# Altium footprint library Face_InMain1V0.PcbLib: 83 footprints (part 4 of 6)
Each footprint in its own frame and in the unit in brackets; x right, y up, seen from the top. Pads: shape width x height; smd on the part's side, far side on the other; paste and mask are expansions set on the pad; w line width, h text height; cw(c..) or ccw(c..) is an arc to the next point about the centre after c.
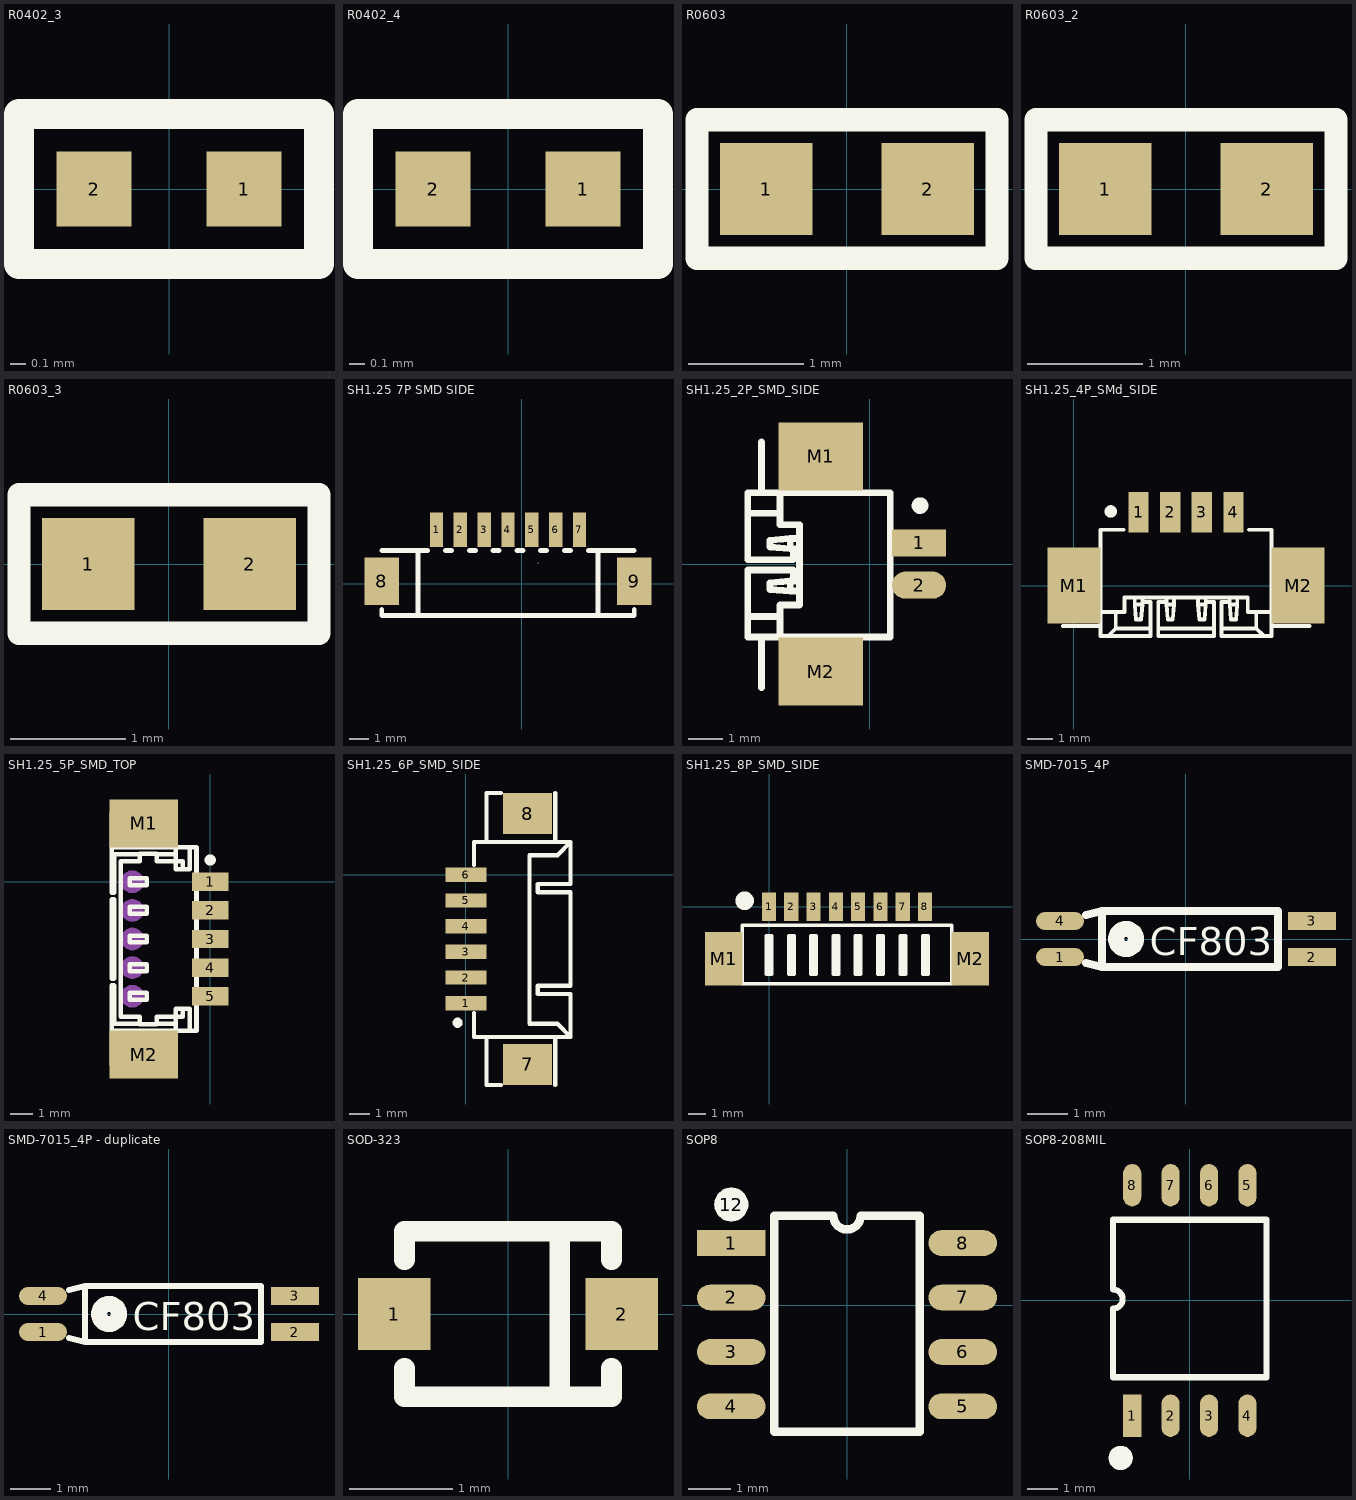
[diagram p3: the footprints below, top view; thin cyan lines are the x and y axes]

## R0402_3 [mm]
pads (2):
  rect 0.5x0.5 smd: 1(0.5,0) 2(-0.5,0)
Top Overlay:
  lines w0.2: -1,-0.5 -1,0.5 1,0.5 1,-0.5 -1,-0.5
3D body "User Library-R_0402.STEP": height 0.35, standoff 0, extent -0.5,-0.25 0.5,0.25

## R0402_4 [mm]
pads (2):
  rect 0.5x0.5 smd: 1(0.5,0) 2(-0.5,0)
Top Overlay:
  lines w0.2: -1,-0.5 1,-0.5 1,0.5 -1,0.5 -1,-0.5
3D body "User Library-R_0402.STEP": height 0.35, standoff 0, extent -0.5,-0.25 0.5,0.25

## R0603 [mm]
pads (2):
  rect 0.8x0.8 smd: 1(-0.7,0) 2(0.7,0)
Top Overlay:
  lines w0.2: -1.3,-0.6 -1.3,0.6 1.3,0.6 1.3,-0.6 -1.3,-0.6
3D body "User Library-RES_1609-0603.STEP": height 0.56, standoff 0, extent -0.85,-0.4 0.85,0.4

## R0603_2 [mm]
pads (2):
  rect 0.8x0.8 smd: 1(-0.7,0) 2(0.7,0)
Top Overlay:
  lines w0.2: -1.3,-0.6 1.3,-0.6 1.3,0.6 -1.3,0.6 -1.3,-0.6
3D body "User Library-RES_1609-0603.STEP": height 0.56, standoff 0, extent -0.85,-0.4 0.85,0.4

## R0603_3 [mm]
pads (2):
  rect 0.8x0.8 smd: 1(-0.7,0) 2(0.7,0)
Top Overlay:
  lines w0.2: -1.3,-0.6 -1.3,0.6 1.3,0.6 1.3,-0.6 -1.3,-0.6
3D body "User Library-RES_1609-0603.STEP": height 0.56, standoff 0, extent -0.85,-0.4 0.85,0.4

## SH1.25 7P SMD SIDE [mm] "1.25mm_7P_SMD_Side"
pads (9):
  rect 0.7x1.8 smd: 1(-4.48,2.85) 2(-3.23,2.85) 3(-1.98,2.85) 4(-0.73,2.85) 5(0.52,2.85) 6(1.77,2.85) 7(3.02,2.85)
  rect 1.801x2.499 smd: 8(-7.355,0.15) 9(5.895,0.15)
Top Overlay:
  lines w0.254: -7.356,-1.331 -7.356,-1.651 5.895,-1.651 5.895,-1.331 ; -7.355,1.75 -4.943,1.75 ; -5.455,-1.65 -5.455,1.75 ; -4.017,1.75 -3.693,1.75 ; -2.767,1.75 -2.443,1.75 ; -1.517,1.75 -1.193,1.75 ; -0.267,1.75 0.057,1.75 ; 0.983,1.75 1.307,1.75 ; 2.233,1.75 2.557,1.75 ; 3.483,1.75 5.895,1.75 ; 3.995,-1.651 3.995,1.75
Mechanical 15:
  lines w0.003: 0.832,1.088 0.883,1.138
3D body "10114830-xxx07lfc.stp": height 3.5, standoff 0.02, extent -7.65,-1.85 6.25,3.45

## SH1.25_2P_SMD_SIDE [mm]
pads (4):
  rect 1.6x0.8 smd: 1(1.45,0.625)
  oval 1.6x0.8 smd: 2(1.45,-0.625)
  rect 2.5x2 smd: M1(-1.45,3.175) M2(-1.45,-3.175)
Top Overlay:
  circle w0.254: c1.479,1.722 r0.119
  lines w0.2: -3.6,-1.55 -2.65,-1.55 ; -3.6,1.5 -2.65,1.5 ; -3.2,-3.65 -3.2,-2.15 ; -3.2,2.1 -3.2,3.6 ; -2.65,-2.15 -2.65,-1.21 -2.08,-1.21 -2.08,1.16 -2.65,1.16 -2.65,2.1 ; -2.26,-0.5 -2.26,-0.175 -3.6,-0.175 -3.6,-2.15 0.6,-2.15 0.6,2.1 -3.6,2.1 -3.6,0.125 -2.26,0.125 -2.26,0.45 ; -2.08,-0.8 -2.35,-0.8 ; -2.08,-0.5 -2.35,-0.5 ; -2.08,0.45 -2.35,0.45 ; -2.08,0.75 -2.35,0.75 ; -2.35,-0.8 -2.95,-0.75 -2.95,-0.55 -2.35,-0.5 ; -2.35,-0.8 -2.35,-0.5 ; -2.35,0.45 -2.95,0.5 -2.95,0.7 -2.35,0.75 ; -2.35,0.45 -2.35,0.75
3D body "10114830-XXX02LFc.stp": height 3.4, standoff -0.08, extent -3.5,-3.85 1.8,3.8

## SH1.25_4P_SMd_SIDE [mm] "WTB 1.25MM WAFER 90 DEGREE SMT"
pads (6):
  rect 0.8x1.6 smd: 1(2.55,2.9) 2(3.8,2.9) 3(5.05,2.9) 4(6.3,2.9)
  rect 2.1x3 smd: M1(0,0) M2(8.85,0)
Top Overlay:
  circle w0.254: c1.453,2.929 r0.119
  lines w0.15: -0.447,-1.592 1.053,-1.592 ; 1.053,-1.042 1.993,-1.042 1.993,-0.472 6.863,-0.472 6.863,-1.042 7.803,-1.042 ; 1.353,-1.992 1.653,-1.692 ; 1.653,-1.042 1.653,-1.692 ; 1.953,2.208 1.053,2.208 1.053,-1.992 3.028,-1.992 3.028,-0.652 2.703,-0.652 ; 2.403,-0.472 2.403,-0.742 ; 2.703,-0.472 2.703,-0.742 ; 3.028,-1.692 1.653,-1.692 ; 3.328,-1.692 5.528,-1.692 ; 3.653,-0.652 3.328,-0.652 3.328,-1.992 5.528,-1.992 5.528,-0.652 5.203,-0.652 ; 3.653,-0.472 3.653,-0.742 ; 3.953,-0.472 3.953,-0.742 ; 4.903,-0.472 4.903,-0.742 ; 5.203,-0.472 5.203,-0.742 ; 5.828,-1.692 7.203,-1.692 ; 6.153,-0.652 5.828,-0.652 5.828,-1.992 7.803,-1.992 7.803,2.208 6.903,2.208 ; 6.153,-0.472 6.153,-0.742 ; 6.453,-0.472 6.453,-0.742 ; 7.203,-1.042 7.203,-1.692 ; 7.503,-1.992 7.203,-1.692 ; 7.803,-1.592 9.303,-1.592 ; 2.403,-0.742 2.453,-1.342 2.653,-1.342 2.703,-0.742 ; 2.403,-0.742 2.703,-0.742 ; 3.653,-0.742 3.703,-1.342 3.903,-1.342 3.953,-0.742 ; 3.653,-0.742 3.953,-0.742 ; 4.903,-0.742 5.203,-0.742 ; 4.903,-0.742 4.953,-1.342 5.153,-1.342 5.203,-0.742 ; 6.153,-0.742 6.203,-1.342 6.403,-1.342 6.453,-0.742 ; 6.153,-0.742 6.453,-0.742
3D body "1.25MM WAFER SMT RIGHT ANGLE, 4 POSITIONS, TIN PLATING.STEP": height 3.45, standoff -0.03, extent -0.635,-1.972 9.515,3.328

## SH1.25_5P_SMD_TOP [mm] "WAFER 1.25mm TOP ENTRY SMT"
height 4.7
pads (12):
  rect 1.6x0.8 smd: 1(0,0) 2(0,-1.25) 3(0,-2.5) 4(0,-3.75) 5(0,-5)
  rect 3x2.1 smd: M1(-2.9,2.55) M2(-2.9,-7.55)
  round 1 on Mech4 mask+0.05: ""(-3.4,-5) ""(-3.4,-3.75) ""(-3.4,-2.5) ""(-3.4,-1.25) ""(-3.4,0)
Top Overlay:
  circle w0.254: c0,0.95 r0.119
  lines w0.2: -4.3,-6.5 -0.6,-6.5 -0.6,1.5 -4.3,1.5 ; -3.07,-6.2 -4.2,-6.2 -4.2,-4.525 -4.3,-4.525 -4.3,-8 -1.5,-8 -1.5,-5.55 -0.9,-5.55 -0.9,-6.5 ; -3.07,1.2 -4.2,1.2 -4.2,-0.475 -4.3,-0.475 -4.3,3 -1.5,3 -1.5,0.55 -0.9,0.55 -0.9,1.5 ; -2.33,-6.2 -1.5,-6.2 ; -2.33,1.2 -1.5,1.2 ; -1.2,-5.55 -1.2,-5.9 -2.33,-5.9 -2.33,-6.23 -3.07,-6.23 -3.07,-5.9 -3.9,-5.9 -3.9,0.9 -3.07,0.9 -3.07,1.23 -2.33,1.23 -2.33,0.9 -1.2,0.9 -1.2,0.55 ; -4.3,-4.225 -4.3,-0.775 -4.2,-0.775 -4.2,-4.225 -4.3,-4.225 ; -3.52,-5.15 -2.77,-5.15 -2.77,-4.85 -3.52,-4.85 -3.52,-5.15 ; -3.52,-3.9 -2.77,-3.9 -2.77,-3.6 -3.52,-3.6 -3.52,-3.9 ; -3.52,-2.65 -2.77,-2.65 -2.77,-2.35 -3.52,-2.35 -3.52,-2.65 ; -3.52,-1.4 -2.77,-1.4 -2.77,-1.1 -3.52,-1.1 -3.52,-1.4 ; -3.52,-0.15 -2.77,-0.15 -2.77,0.15 -3.52,0.15 -3.52,-0.15
3D body "10114828-XXX05LFc.STEP": height 4.65, standoff 0, extent -4.38,-8.2 -0.15,3.2

## SH1.25_6P_SMD_SIDE [mm] "WAFER 1.25mm SIDE ENTRY SMT"
pads (8):
  rect 2x0.7 smd mask+0.05: 1(0,-6.25) 2(0,-5) 3(0,-3.75) 4(0,-2.5) 5(0,-1.25) 6(0,0)
  rect 2.4x2 smd mask+0.05: 7(3,-9.225) 8(3,2.975)
Top Overlay:
  circle w0.254: c-0.4,-7.2 r0.119
  lines w0.2: 0.4,-6.725 0.4,-7.9 5.1,-7.9 ; 0.4,0.475 0.4,1.6 5.1,1.6 ; 1,-7.9 1,-10.225 1.7,-10.225 ; 1,1.6 1,3.975 1.7,3.975 ; 4.35,-10.225 4.35,-7.9 ; 4.35,1.6 4.35,3.975 ; 5.1,-7.9 4.45,-7.25 3.1,-7.25 3.1,0.95 4.45,0.95 5.1,1.6 ; 5.1,-7.9 5.1,-5.8 3.5,-5.8 3.5,-5.4 5.1,-5.4 5.1,-0.85 3.5,-0.85 3.5,-0.45 5.1,-0.45 5.1,1.2 5.1,1.6
3D body "10114830-XXX06LFc.stp": height 3.45, standoff -0.02, extent -0.406,-9.5 4.894,3.15

## SH1.25_8P_SMD_SIDE [mm] "WAFER 1.25mm TOP ENTRY SMT"
height 4.7
pads (10):
  rect 0.8x1.6 smd: 1(0,0) 2(1.25,0) 3(2.5,0) 4(3.75,0) 5(5,0) 6(6.25,0) 7(7.5,0) 8(8.75,0)
  rect 2.1x3 smd: M1(-2.55,-2.9) M2(11.3,-2.9)
Top Overlay:
  drawing of 294 lines, arcs and shapes, not listed
3D body "10114830-xxx08lfc.stp": height 3.5, standoff 0.02, extent -3.257,-5.021 11.893,0.279

## SMD-7015_4P [mm]
pads (4):
  oval 1.2x0.45 smd: 1(-3.15,-0.45) 4(-3.15,0.45)
  rect 1.2x0.45 smd: 2(3.15,-0.45) 3(3.15,0.45)
Top Overlay:
  circle w0.4: c-1.5,0 r0.25
  lines w0.2: -2.5,-0.6 -2.1,-0.7 ; -2.5,0.6 -2.1,0.7 ; -2.1,-0.7 -2.1,0.7 ; -2.1,-0.7 2.3,-0.7 2.3,0.7 -2.1,0.7
  text "CF803" at -0.9,-0.4 h0.7
3D body: height 1.3, standoff 0, extent -3.4,-0.7 3.4,0.7

## SMD-7015_4P - duplicate [mm]
pads (4):
  oval 1.2x0.45 smd: 1(-3.15,-0.45) 4(-3.15,0.45)
  rect 1.2x0.45 smd: 2(3.15,-0.45) 3(3.15,0.45)
Top Overlay:
  circle w0.4: c-1.5,0 r0.25
  lines w0.15: -2.5,-0.6 -2.1,-0.7 ; -2.5,0.6 -2.1,0.7 ; -2.1,-0.7 2.3,-0.7 2.3,0.7 -2.1,0.7 ; -2.1,-0.7 -2.1,0.7
  text "CF803" at -0.9,-0.4 h0.7
3D body: height 1.3, standoff 0, extent -3.4,-0.7 3.4,0.7

## SOD-323 [mm]
pads (2):
  rect 0.7x0.7 smd: 1(-1.1,0) 2(1.1,0)
Top Overlay:
  lines w0.2: -1,-0.524 -1,-0.8 1,-0.8 1,-0.524 ; -1,0.524 -1,0.8 1,0.8 1,0.524 ; 0.5,-0.7 0.5,0.7
3D body "User Library-SOD-323-1.STEP": height 1.01, standoff -0.12, extent -1.411,-0.65 1.411,0.65

## SOP8 [mm]
pads (9):
  rect 1.6x0.6 smd: 1(-2.7,1.455)
  oval 1.6x0.6 smd: 2(-2.7,0.185) 3(-2.7,-1.085) 4(-2.7,-2.355) 5(2.7,-2.355) 6(2.7,-1.085) 7(2.7,0.185) 8(2.7,1.455)
  round 0.8 on Top Overlay: 12(-2.7,2.355)
Top Overlay:
  lines w0.2: -1.7,-2.945 -1.7,2.09 -1.3,2.09 -0.765,2.09 -0.318,2.09 ccw(c0,2.09) 0.318,2.09 0.765,2.09 1.3,2.09 1.7,2.09 1.7,-2.945 0.9,-2.945 -1.7,-2.945
3D body "User Library-sop-8.STEP": height 1.6, standoff 0, extent -3.011,-2.94 3.031,2.08

## SOP8-208MIL [mm]
pads (8):
  rect 0.6x1.4 smd mask+0.05: 1(-1.905,-3.81)
  oval 0.6x1.4 smd mask+0.05: 2(-0.635,-3.81) 3(0.635,-3.81) 4(1.905,-3.81) 5(1.905,3.81) 6(0.635,3.81) 7(-0.635,3.81) 8(-1.905,3.81)
Top Overlay:
  circle w0.4: c-2.286,-5.207 r0.2
  lines w0.2: -2.54,-2.54 -2.54,-0.275 ccw(c-2.54,0.043) -2.54,0.36 -2.54,2.667 2.54,2.667 2.54,-2.54 -2.54,-2.54
3D body "User Library-SOP2-8.STEP": height 1.9, standoff 0, extent -2.745,-4.067 2.745,4.067